# Altium integrated library vme6U_carrier_Cyc_V_SoC.IntLib: 56 symbols
Pins are listed as number, name and electrical type; pins without a type are passive.

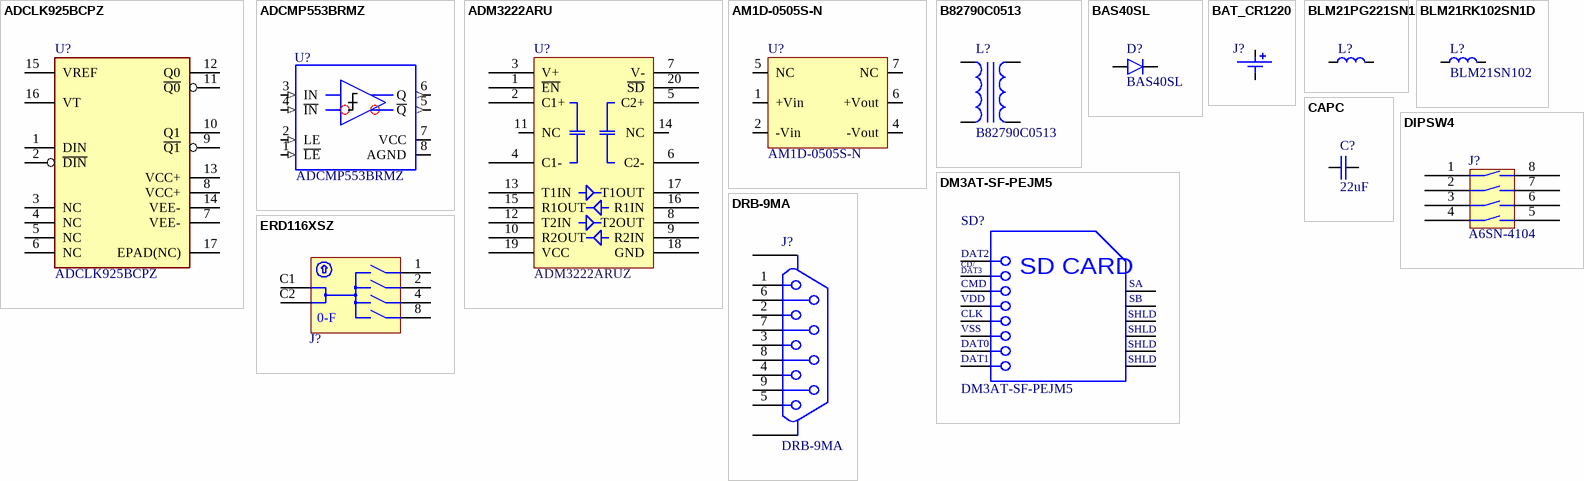
[diagram p0: symbols ADCLK925BCPZ to ERD116XSZ]

## ADCLK925BCPZ
designator U?
IC CLK FANOUT BUFFER 1:2 16LFCSP; Manufacturer: Silicon Labs; Number Of Inputs: 2; Standoff Height: 0mm; Number Of Outputs: 4; Pkg: LFCSP-16EP; Max Junction Temp: +125°C; Min Supply Voltage: 1.71V; Number Of Elements: 1; Nominal Supply Current: 65mA; Max Supply Voltage: 3.63V; Logic Function: Non-Inverting; Propagation Delay: 875ps; Maintainer: Evgeniy Kotov; SMD Solders: 17; THD Solders: 0; Manufacturer Part Number: ADCLK925BCPZ; Ambient Temperature Range High: +85°C; Device Class L2: Clock and Timing; Temperature: -40°C to +85°C; Automotive: No; Height: 0.9mm; ComponentLink2URL: https://www.silabs.com/documents/public/data-sheets/si5330x-datasheet.pdf; ComponentLink2Description: Datasheet; Temperature Range High: +85°C; Category: IC; Ambient Temperature Range Low: -40°C; Device Class L1: Integrated Circuits (ICs); Octopart: https://octopart.com/si53307-b-gm-silicon+labs-51374320; Mouser Description: Clock Buffer 1:2 Univ bufr/Lvl Trans 725MHz; Temperature Range Low: -40°C; Device Class L3: Clock Buffers; Ipc Land Pattern Name: QFN50P300X300X85-16; RoHS: TRUE; Digikey Description: IC CLK BUFFER 2:4 725MHZ 16QFN; Lead Free: Yes; PartField: ADCLK925BCPZ; Last Change Data: 09.03.2017; Value: ADCLK925BCPZ
footprint QFN50P300X300X100-17N-S150 (QFN, 0.50mm Pitch, Square; 4 pin X 4 pin, 3mm X 3mm X 1.00mm H Body (w/thermal tab 1.50 X 1.50mm), IPC Medium Density)
pins: 1 DIN, 2 ~{DIN}, 3 NC, 4 NC, 5 NC, 6 NC, 7 VEE- (power), 8 VCC+ (power), 9 ~{Q1}, 10 Q1, 11 ~{Q0}, 12 Q0, 13 VCC+, 14 VEE-, 15 VREF (power), 16 VT (power), 17 EPAD(NC) (power)

## ADCMP553BRMZ
designator U?
LVDS Comparator; Vendor: Analog Devices Inc; SolderOption: 0; Pkg: MSOP-8; SMD Solders: 8; Manufacturer_Part_Number: ADCMP553BRMZ; Value: ADCMP553BRMZ; PartField: ADCMP553BRMZ; THD Solders: 0
footprint SOP65P490X110-8N (SOP, 0.65mm pitch; 8 pin, 3.00mm W X 3.00mm L X 1.10mm H body, IPC Medium Density)
pins: 1 ~{LE} (in), 2 LE (in), 3 IN (in), 4 ~{IN} (in), 5 ~{Q} (out), 6 Q (out), 7 VCC (power), 8 AGND (power)

## ADM3222ARU
designator U?, comment ADM3222ARUZ
RS232; Pkg: TSSOP-20; SMD Solders: 20; THD Solders: 0; Vendor: Analog Devices; ComponentLink1URL: https://www.analog.com/media/en/technical-documentation/data-sheets/ADM3202_3222_1385.pdf; Last Change Date: 24.05.2019; PartField: ADM3222ARUZ; Value: ADM3222
footprint SOP65P640X110-20N (SOP, 20-Leads, Body 6.6x4.5mm (max), Pitch 0.65mm, IPC Medium Density)
pins: 1 ~{EN}, 2 C1+, 3 V+, 4 C1-, 5 C2+, 6 C2-, 7 V-, 8 T2OUT, 9 R2IN, 10 R2OUT, 11 NC, 12 T2IN, 13 T1IN, 14 NC, 15 R1OUT, 16 R1IN, 17 T1OUT, 18 GND, 19 VCC, 20 ~{SD}

## AM1D-0505S-N
designator U?
AM3G-0505DZ; Manufactuer: Aimtec; SolderOption: 0; Pkg: SIP-7pin; THD Solders: 7; HelpURL: http://www.aimtec.com/site/Aimtec/files/Datasheet/HighResolution/AM1D-NZ.pdf; Manufacturer: Aimtec; PartField: AM1D-0505S-N; Value: AM1D-0505S-N; Vendor: Aimtec; SMD Solders: 0
footprint SIP-7
pins: 1 +Vin, 2 -Vin, 4 -Vout, 5 NC, 6 +Vout, 7 NC

## B82790C0513
designator L?
Pkg: SMD 4 pin; SMD Solders: 4; THD Solders: 0; Vendor: Epcos; PartField: B82790C0513; Value: B82790C0513
footprint SMD_B82790 (Footprint not found)
pins: 1, 2, 3, 4

## BAS40SL
designator D?
Schottky Barrier Diode; Pkg: SOD-923F; Vendor: Vishay; Maintainer: Evgeniy Kotov; SMD Solders: 2; THD Solders: 0; Forward Current: 100mA; Reverse Voltage: 40V; Forward Voltage: 0.38V @ 1mA / 1V @ 40mA; Reverse Current: 15mA; PartField: BAS40SL; Release Date: 28.03.2017; Last Change Data: 28.03.2017; Temperature Range: -55°C to +150°C; Value: BAS40SL
footprint SOD_923
pins: 1 A, 2 C

## BAT_CR1220
designator J?, comment BC501SM  (value not drawn)
BATTERY HOLDER COIN 12.5MM SMD; SMD Solders: 2; THD Solders: 0; Maintainer: Evgeniy Kotov; Pkg: 12MM SMD; PartField: BC501SM; Last Change Data: 02.04.2017; Release Date: 02.04.2017; Value: BC501SM; ComponentLink1Description: Datasheet
footprint BAT_CR1220 (2 Contacts - Pitch 2.54mm - Single Row Straight Strip Male Header)
pins: 1 +, 2 -
1 alternate drawing of the same symbol

## BLM21PG221SN1
designator L?  (value not drawn)
Ferrite Beads, 0805, 220 Ohm, 2A; Pkg: 0805; Vendor: Murata; Maintainer: Evgeniy Kotov; SMD Solders: 2; THD Solders: 0; DC Current: 200mA; Tolerance: 25%; DC Resistance: 50mΩ; PartField: BLM21PG221SN1; Release Date: 30.03.2017; Last Change Data: 30.03.2017; Temperature Range: -55°C to +125°C; Value: BLM21PG221SN1
simulation model Inductor (Generic Inductor)
footprint INDC2012N (Chip Inductor, EIA 0805, Metric 2012, Body 2.0x1.2mm, IPC Medium Density)
pins: 1, 2

## BLM21RK102SN1D
designator L?  value BLM21SN102  (hidden comment: BLM21RK102SN1D)
Ferrite Beads, 0805, 1 kOhm; Pkg: 0805; Vendor: Murata; Maintainer: Evgeniy Kotov; SMD Solders: 2; THD Solders: 0; DC Current: 200mA; Tolerance: 25%; DC Resistance: 500mΩ; PartField: BLM21RK102SN1D; Release Date: 30.03.2017; Last Change Data: 30.03.2017; Temperature Range: -55°C to +125°C
simulation model Inductor (Generic Inductor)
footprint INDC2012N (Chip Inductor, EIA 0805, Metric 2012, Body 2.0x1.2mm, IPC Medium Density)
pins: 1, 2

## CAPC
designator C?, comment 22uF
Generic ceramic SMD capacitor; Pkg: 0805; Maintainer: Evgeniy Kotov; SMD Solders: 2; THD Solders: 0; PartField: 22uF; Last Change Data: 06.03.2017; Release Date: 06.03.2017; Value: 22uF
footprint CAPC1608N (Chip Capacitor, Body 1.6x0.8mm (0603), IPC Medium Density)
footprint CAPC2012N (Chip Capacitor, Body 2.0x1.25mm (0805), IPC Medium Density)
footprint CAPC3216N (Chip Capacitor, Body 3.2x1.6mm (1206), IPC Medium Density)
footprint CAPC3225N (Chip Capacitor, Body 3.2x2.5mm (1210), IPC Medium Density)
footprint CAPC5750N (Chip Capacitor, Body 5.7x5.0mm (2220), IPC Medium Density)
simulation model Capacitor (Generic Capacitor)
pins: 1, 2

## DIPSW4
designator J?, comment A6SN-4104
SMD DIP Switch, Omron A6H or A6SN series; SMD Solders: 8; THD Solders: 0; Pkg: SMD 8pin; Value: A6SN-4104; Manufacturer: Omron; PartField: A6SN-4104
footprint DIPSW4-A6SN8
pins: 1, 2, 3, 4, 5, 6, 7, 8

## DM3AT-SF-PEJM5
designator SD?
Micro SD Card Connector, 0.5 A, 125 V, -25 to 85 degC, 8-Pin SMD, RoHS, Tape and Reel; Manufacturer: Hirose Electric; Featured Product: DM3ATSeries; HTML Datasheet: DM3SeriesmicroSD.html; Other Names: HR1964DKR; Connector Type: ConnectorandEjector; Insertion, Removal Method: PushIn,PushOut; Card Type: SecureDigital-microSD™; Online Catalog: DM3Series; Number of Positions: 10(8+2); Product Training Modules: DM3SeriesmicroSDCardSockets; Pkg: SD card hlder; SMD Solders: 14; THD Solders: 0; Manufacturer URL: https://www.hirose.com; Contact Finish: Gold; Family: MemoryConnectors-PCCardSockets; Package Reference: DM3AT-8; Category: Connectors,Interconnects; Features: Switch; Mounting Type: SurfaceMount,RightAngle; Datasheet Version: Jun-10; Package Description: 8-Pin Surface Mount Device, Body 16.15 x 13.85 mm, Pitch 1.1 mm; Standard Package: 1; Contact Finish Thickness: -; Datasheet URL: https://ciiva.com/datasheet-click-46418261?src=ciiva&sig=4019062a; Mounting Feature: Normal,Standard-Top; Series: DM3; Packaging: Digi-Reel; Package URL: https://www.hirose.com/product/en/download_file/key_name/DM3/category/Catalog/doc_file_id/49662/?file_category_id=4&item_id=195&is_series=1; Ejector Side: -; Value: DM3AT-SF-PEJM5; Vendor: Hirose Electric; PartField: DM3AT-SF-PEJM5
footprint SD_HRS-DM3AT-8_V
pins: 1 DAT2, 2 CD/DAT3, 3 CMD, 4 VDD, 5 CLK, 6 VSS, 7 DAT0, 8 DAT1, 9 SA, 10 SB, 11 SHLD, 12 SHLD, 13 SHLD, 14 SHLD
text: CD/; DAT3; SD CARD

## DRB-9MA
designator J?
D-SUB; 9-pin, male, flange 7.2mm; SolderOption: 0; THD Solders: 11; PartField: DRB-9MA; Value: DRB-9MA; Pkg: DRB-9MA; SMD Solders: 0
footprint DRB-9MA
pins: 1, 2, 3, 4, 5, 6, 7, 8, 9, S1 SHLD, S2 SHLD

## ERD116XSZ
designator J?  (value not drawn)
Vendor: ECE; SolderOption: 0; Pkg: Rotary 6pin; THD Solders: 6; Value: ERD116XSZ; PartField: ERD116XSZ; SMD Solders: 0
footprint SW_ECE_ERD116XSZ (Body 7.4x7.4mm SMT Hexadecimal Rotary Switches)
pins: 1, 2, 4, 8, C1 C, C2 C
text: 0-F

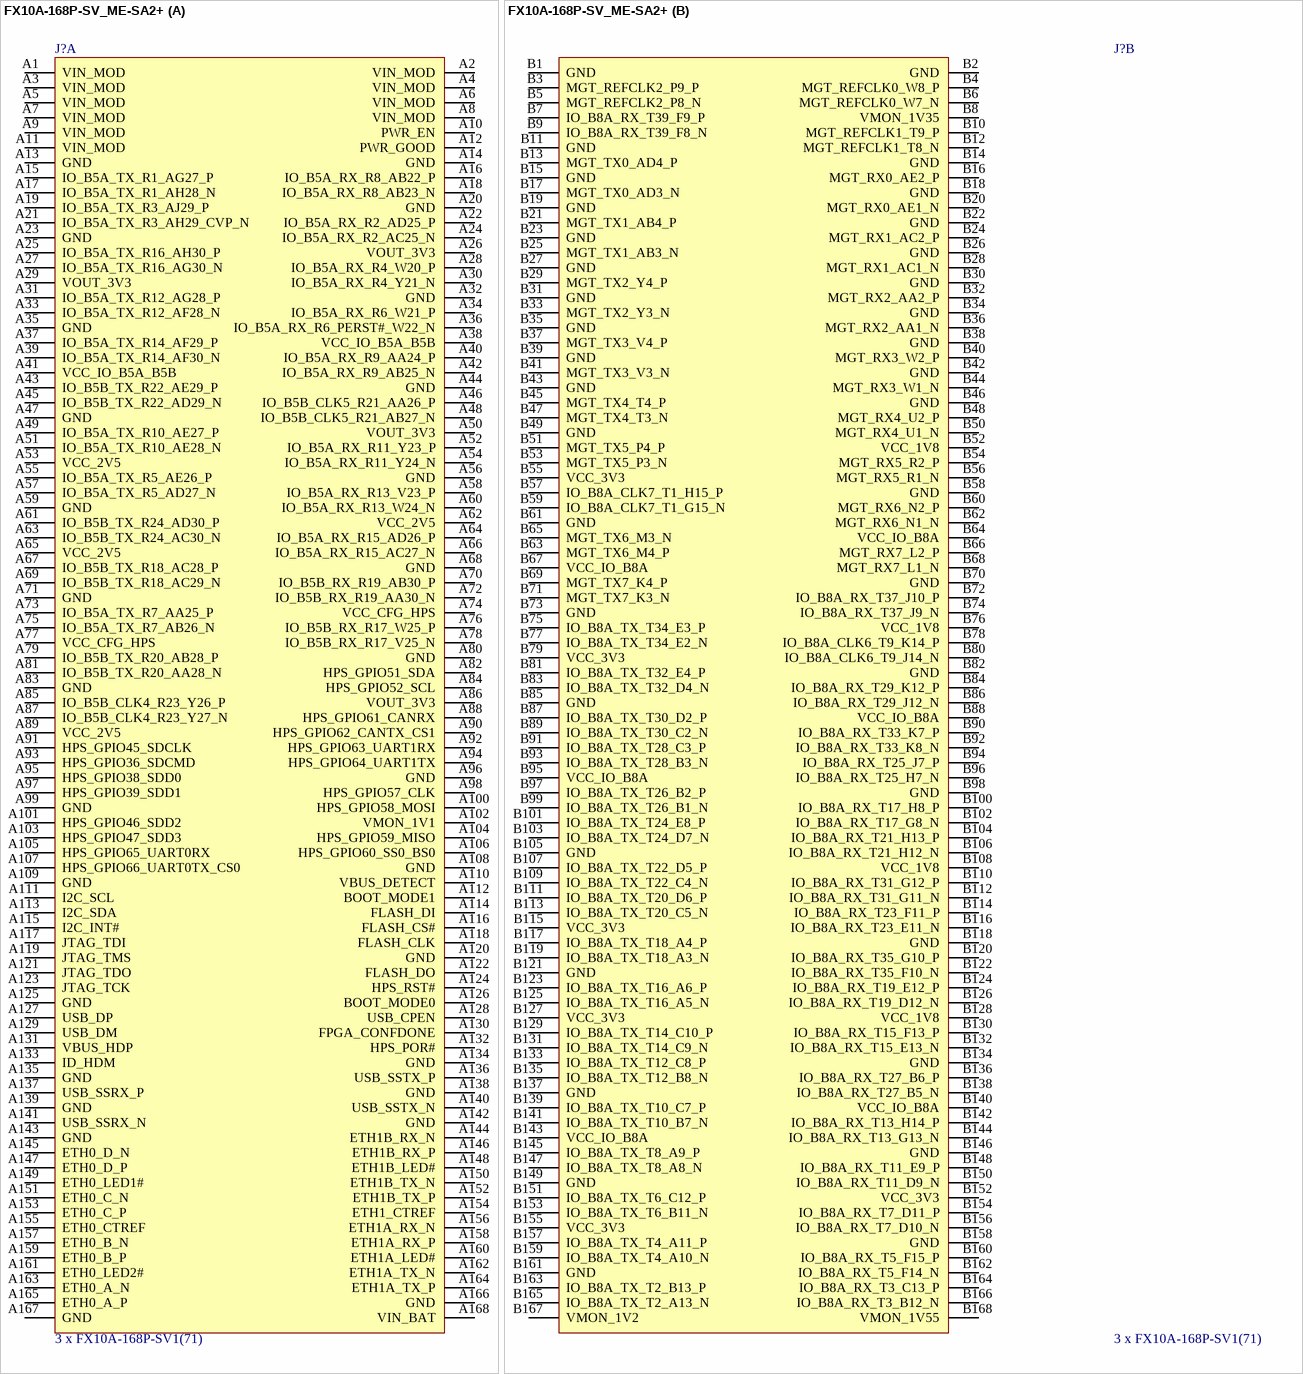
[diagram p1: symbol FX10A-168P-SV_ME-SA2+]

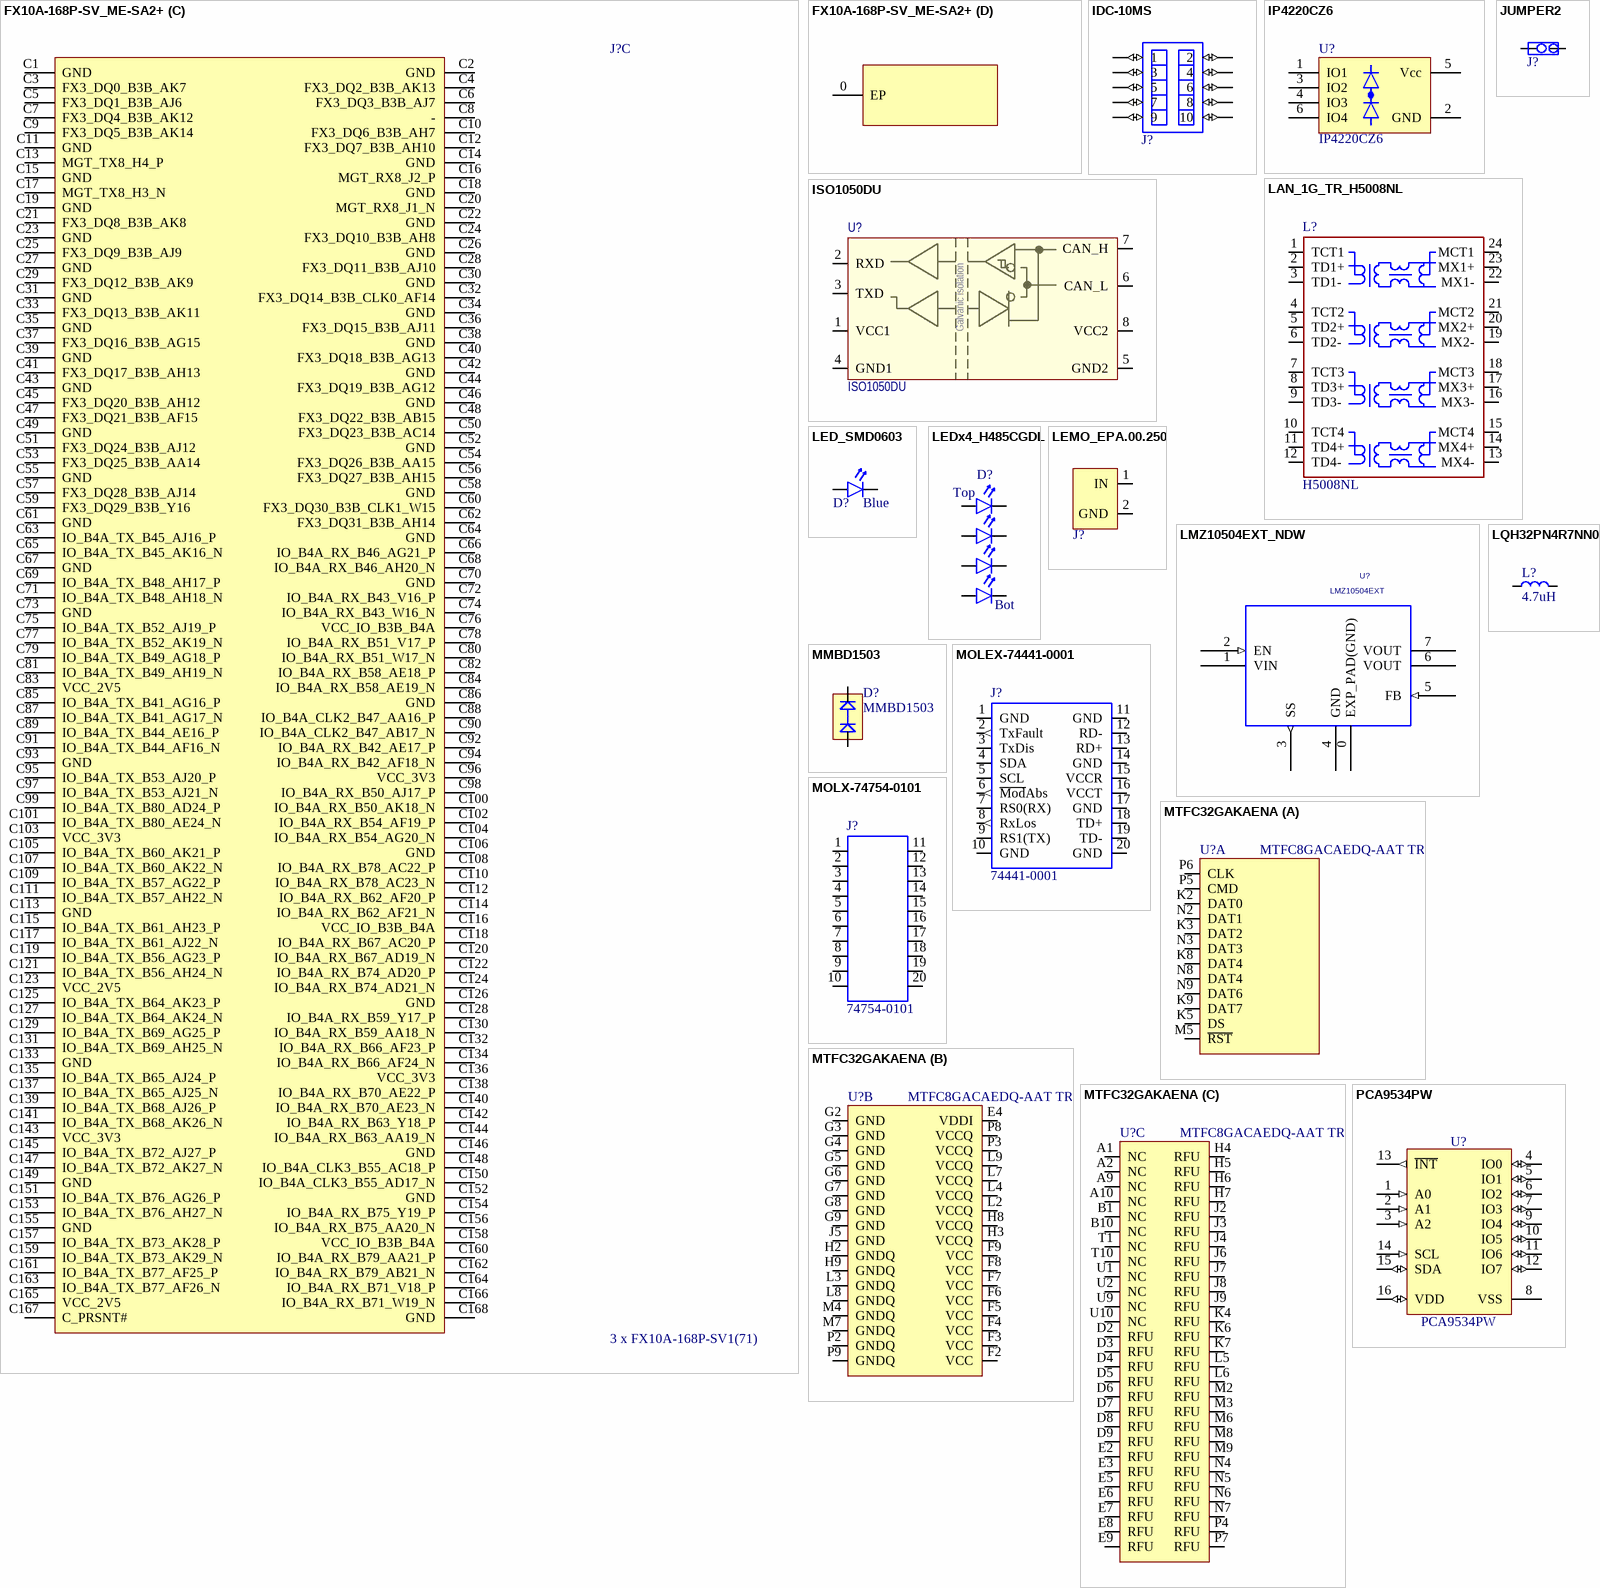
[diagram p2: symbols FX10A-168P-SV_ME-SA2+ to PCA9534PW]

## FX10A-168P-SV_ME-SA2+
designator J?, comment 3 x FX10A-168P-SV1(71)
Pin_Count: 168; SolderOption: 0; Pkg: SMD 170pin; SMD Solders: 170; HelpURL: https://www.hirose.com/product/document?clcode=CL0570-0044-8-71&productname=FX10A-168P-SV(71)&series=FX10&documenttype=Catalog&lang=ru&documentid=D31650_en; PartField: FX10A-168P-SV1(71); Value: 3 x FX10A-168P-SV1(71); THD Solders: 0
footprint Mercury_SA2p
part A pins: A1 VIN_MOD, A2 VIN_MOD, A3 VIN_MOD, A4 VIN_MOD, A5 VIN_MOD, A6 VIN_MOD, A7 VIN_MOD, A8 VIN_MOD, A9 VIN_MOD, A10 PWR_EN, A11 VIN_MOD, A12 PWR_GOOD, A13 GND, A14 GND, A15 IO_B5A_TX_R1_AG27_P, A16 IO_B5A_RX_R8_AB22_P, A17 IO_B5A_TX_R1_AH28_N, A18 IO_B5A_RX_R8_AB23_N, A19 IO_B5A_TX_R3_AJ29_P, A20 GND, A21 IO_B5A_TX_R3_AH29_CVP_N, A22 IO_B5A_RX_R2_AD25_P, A23 GND, A24 IO_B5A_RX_R2_AC25_N, A25 IO_B5A_TX_R16_AH30_P, A26 VOUT_3V3, A27 IO_B5A_TX_R16_AG30_N, A28 IO_B5A_RX_R4_W20_P, A29 VOUT_3V3, A30 IO_B5A_RX_R4_Y21_N, A31 IO_B5A_TX_R12_AG28_P, A32 GND, A33 IO_B5A_TX_R12_AF28_N, A34 IO_B5A_RX_R6_W21_P, A35 GND, A36 IO_B5A_RX_R6_PERST#_W22_N, A37 IO_B5A_TX_R14_AF29_P, A38 VCC_IO_B5A_B5B, A39 IO_B5A_TX_R14_AF30_N, A40 IO_B5A_RX_R9_AA24_P, A41 VCC_IO_B5A_B5B, A42 IO_B5A_RX_R9_AB25_N, A43 IO_B5B_TX_R22_AE29_P, A44 GND, A45 IO_B5B_TX_R22_AD29_N, A46 IO_B5B_CLK5_R21_AA26_P, A47 GND, A48 IO_B5B_CLK5_R21_AB27_N, A49 IO_B5A_TX_R10_AE27_P, A50 VOUT_3V3, A51 IO_B5A_TX_R10_AE28_N, A52 IO_B5A_RX_R11_Y23_P, A53 VCC_2V5, A54 IO_B5A_RX_R11_Y24_N, A55 IO_B5A_TX_R5_AE26_P, A56 GND, A57 IO_B5A_TX_R5_AD27_N, A58 IO_B5A_RX_R13_V23_P, A59 GND, A60 IO_B5A_RX_R13_W24_N, A61 IO_B5B_TX_R24_AD30_P, A62 VCC_2V5, A63 IO_B5B_TX_R24_AC30_N, A64 IO_B5A_RX_R15_AD26_P, A65 VCC_2V5, A66 IO_B5A_RX_R15_AC27_N, A67 IO_B5B_TX_R18_AC28_P, A68 GND, A69 IO_B5B_TX_R18_AC29_N, A70 IO_B5B_RX_R19_AB30_P, A71 GND, A72 IO_B5B_RX_R19_AA30_N, A73 IO_B5A_TX_R7_AA25_P, A74 VCC_CFG_HPS, A75 IO_B5A_TX_R7_AB26_N, A76 IO_B5B_RX_R17_W25_P, A77 VCC_CFG_HPS, A78 IO_B5B_RX_R17_V25_N, A79 IO_B5B_TX_R20_AB28_P, A80 GND, A81 IO_B5B_TX_R20_AA28_N, A82 HPS_GPIO51_SDA, A83 GND, A84 HPS_GPIO52_SCL, A85 IO_B5B_CLK4_R23_Y26_P, A86 VOUT_3V3, A87 IO_B5B_CLK4_R23_Y27_N, A88 HPS_GPIO61_CANRX, A89 VCC_2V5, A90 HPS_GPIO62_CANTX_CS1, A91 HPS_GPIO45_SDCLK, A92 HPS_GPIO63_UART1RX, A93 HPS_GPIO36_SDCMD, A94 HPS_GPIO64_UART1TX, A95 HPS_GPIO38_SDD0, A96 GND, A97 HPS_GPIO39_SDD1, A98 HPS_GPIO57_CLK, A99 GND, A100 HPS_GPIO58_MOSI, A101 HPS_GPIO46_SDD2, A102 VMON_1V1, A103 HPS_GPIO47_SDD3, A104 HPS_GPIO59_MISO, A105 HPS_GPIO65_UART0RX, A106 HPS_GPIO60_SS0_BS0, A107 HPS_GPIO66_UART0TX_CS0, A108 GND, A109 GND, A110 VBUS_DETECT, A111 I2C_SCL, A112 BOOT_MODE1, A113 I2C_SDA, A114 FLASH_DI, A115 I2C_INT#, A116 FLASH_CS#, A117 JTAG_TDI, A118 FLASH_CLK, A119 JTAG_TMS, A120 GND, A121 JTAG_TDO, A122 FLASH_DO, A123 JTAG_TCK, A124 HPS_RST#, A125 GND, A126 BOOT_MODE0, A127 USB_DP, A128 USB_CPEN, A129 USB_DM, A130 FPGA_CONFDONE, A131 VBUS_HDP, A132 HPS_POR#, A133 ID_HDM, A134 GND, A135 GND, A136 USB_SSTX_P, A137 USB_SSRX_P, A138 GND, A139 GND, A140 USB_SSTX_N, A141 USB_SSRX_N, A142 GND, A143 GND, A144 ETH1B_RX_N, A145 ETH0_D_N, A146 ETH1B_RX_P, A147 ETH0_D_P, A148 ETH1B_LED#, A149 ETH0_LED1#, A150 ETH1B_TX_N, A151 ETH0_C_N, A152 ETH1B_TX_P, A153 ETH0_C_P, A154 ETH1_CTREF, A155 ETH0_CTREF, A156 ETH1A_RX_N, A157 ETH0_B_N, A158 ETH1A_RX_P, A159 ETH0_B_P, A160 ETH1A_LED#, A161 ETH0_LED2#, A162 ETH1A_TX_N, A163 ETH0_A_N, A164 ETH1A_TX_P, A165 ETH0_A_P, A166 GND, A167 GND, A168 VIN_BAT
part B pins: B1 GND, B2 GND, B3 MGT_REFCLK2_P9_P, B4 MGT_REFCLK0_W8_P, B5 MGT_REFCLK2_P8_N, B6 MGT_REFCLK0_W7_N, B7 IO_B8A_RX_T39_F9_P, B8 VMON_1V35, B9 IO_B8A_RX_T39_F8_N, B10 MGT_REFCLK1_T9_P, B11 GND, B12 MGT_REFCLK1_T8_N, B13 MGT_TX0_AD4_P, B14 GND, B15 GND, B16 MGT_RX0_AE2_P, B17 MGT_TX0_AD3_N, B18 GND, B19 GND, B20 MGT_RX0_AE1_N, B21 MGT_TX1_AB4_P, B22 GND, B23 GND, B24 MGT_RX1_AC2_P, B25 MGT_TX1_AB3_N, B26 GND, B27 GND, B28 MGT_RX1_AC1_N, B29 MGT_TX2_Y4_P, B30 GND, B31 GND, B32 MGT_RX2_AA2_P, B33 MGT_TX2_Y3_N, B34 GND, B35 GND, B36 MGT_RX2_AA1_N, B37 MGT_TX3_V4_P, B38 GND, B39 GND, B40 MGT_RX3_W2_P, B41 MGT_TX3_V3_N, B42 GND, B43 GND, B44 MGT_RX3_W1_N, B45 MGT_TX4_T4_P, B46 GND, B47 MGT_TX4_T3_N, B48 MGT_RX4_U2_P, B49 GND, B50 MGT_RX4_U1_N, B51 MGT_TX5_P4_P, B52 VCC_1V8, B53 MGT_TX5_P3_N, B54 MGT_RX5_R2_P, B55 VCC_3V3, B56 MGT_RX5_R1_N, B57 IO_B8A_CLK7_T1_H15_P, B58 GND, B59 IO_B8A_CLK7_T1_G15_N, B60 MGT_RX6_N2_P, B61 GND, B62 MGT_RX6_N1_N, B63 MGT_TX6_M4_P, B64 VCC_IO_B8A, B65 MGT_TX6_M3_N, B66 MGT_RX7_L2_P, B67 VCC_IO_B8A, B68 MGT_RX7_L1_N, B69 MGT_TX7_K4_P, B70 GND, B71 MGT_TX7_K3_N, B72 IO_B8A_RX_T37_J10_P, B73 GND, B74 IO_B8A_RX_T37_J9_N, B75 IO_B8A_TX_T34_E3_P, B76 VCC_1V8, B77 IO_B8A_TX_T34_E2_N, B78 IO_B8A_CLK6_T9_K14_P, B79 VCC_3V3, B80 IO_B8A_CLK6_T9_J14_N, B81 IO_B8A_TX_T32_E4_P, B82 GND, B83 IO_B8A_TX_T32_D4_N, B84 IO_B8A_RX_T29_K12_P, B85 GND, B86 IO_B8A_RX_T29_J12_N, B87 IO_B8A_TX_T30_D2_P, B88 VCC_IO_B8A, B89 IO_B8A_TX_T30_C2_N, B90 IO_B8A_RX_T33_K7_P, B91 IO_B8A_TX_T28_C3_P, B92 IO_B8A_RX_T33_K8_N, B93 IO_B8A_TX_T28_B3_N, B94 IO_B8A_RX_T25_J7_P, B95 VCC_IO_B8A, B96 IO_B8A_RX_T25_H7_N, B97 IO_B8A_TX_T26_B2_P, B98 GND, B99 IO_B8A_TX_T26_B1_N, B100 IO_B8A_RX_T17_H8_P, B101 IO_B8A_TX_T24_E8_P, B102 IO_B8A_RX_T17_G8_N, B103 IO_B8A_TX_T24_D7_N, B104 IO_B8A_RX_T21_H13_P, B105 GND, B106 IO_B8A_RX_T21_H12_N, B107 IO_B8A_TX_T22_D5_P, B108 VCC_1V8, B109 IO_B8A_TX_T22_C4_N, B110 IO_B8A_RX_T31_G12_P, B111 IO_B8A_TX_T20_D6_P, B112 IO_B8A_RX_T31_G11_N, B113 IO_B8A_TX_T20_C5_N, B114 IO_B8A_RX_T23_F11_P, B115 VCC_3V3, B116 IO_B8A_RX_T23_E11_N, B117 IO_B8A_TX_T18_A4_P, B118 GND, B119 IO_B8A_TX_T18_A3_N, B120 IO_B8A_RX_T35_G10_P, B121 GND, B122 IO_B8A_RX_T35_F10_N, B123 IO_B8A_TX_T16_A6_P, B124 IO_B8A_RX_T19_E12_P, B125 IO_B8A_TX_T16_A5_N, B126 IO_B8A_RX_T19_D12_N, B127 VCC_3V3, B128 VCC_1V8, B129 IO_B8A_TX_T14_C10_P, B130 IO_B8A_RX_T15_F13_P, B131 IO_B8A_TX_T14_C9_N, B132 IO_B8A_RX_T15_E13_N, B133 IO_B8A_TX_T12_C8_P, B134 GND, B135 IO_B8A_TX_T12_B8_N, B136 IO_B8A_RX_T27_B6_P, B137 GND, B138 IO_B8A_RX_T27_B5_N, B139 IO_B8A_TX_T10_C7_P, B140 VCC_IO_B8A, B141 IO_B8A_TX_T10_B7_N, B142 IO_B8A_RX_T13_H14_P, B143 VCC_IO_B8A, B144 IO_B8A_RX_T13_G13_N, B145 IO_B8A_TX_T8_A9_P, B146 GND, B147 IO_B8A_TX_T8_A8_N, B148 IO_B8A_RX_T11_E9_P, B149 GND, B150 IO_B8A_RX_T11_D9_N, B151 IO_B8A_TX_T6_C12_P, B152 VCC_3V3, B153 IO_B8A_TX_T6_B11_N, B154 IO_B8A_RX_T7_D11_P, B155 VCC_3V3, B156 IO_B8A_RX_T7_D10_N, B157 IO_B8A_TX_T4_A11_P, B158 GND, B159 IO_B8A_TX_T4_A10_N, B160 IO_B8A_RX_T5_F15_P, B161 GND, B162 IO_B8A_RX_T5_F14_N, B163 IO_B8A_TX_T2_B13_P, B164 IO_B8A_RX_T3_C13_P, B165 IO_B8A_TX_T2_A13_N, B166 IO_B8A_RX_T3_B12_N, B167 VMON_1V2, B168 VMON_1V55
part C pins: C1 GND, C2 GND, C3 FX3_DQ0_B3B_AK7, C4 FX3_DQ2_B3B_AK13, C5 FX3_DQ1_B3B_AJ6, C6 FX3_DQ3_B3B_AJ7, C7 FX3_DQ4_B3B_AK12, C8 -, C9 FX3_DQ5_B3B_AK14, C10 FX3_DQ6_B3B_AH7, C11 GND, C12 FX3_DQ7_B3B_AH10, C13 MGT_TX8_H4_P, C14 GND, C15 GND, C16 MGT_RX8_J2_P, C17 MGT_TX8_H3_N, C18 GND, C19 GND, C20 MGT_RX8_J1_N, C21 FX3_DQ8_B3B_AK8, C22 GND, C23 GND, C24 FX3_DQ10_B3B_AH8, C25 FX3_DQ9_B3B_AJ9, C26 GND, C27 GND, C28 FX3_DQ11_B3B_AJ10, C29 FX3_DQ12_B3B_AK9, C30 GND, C31 GND, C32 FX3_DQ14_B3B_CLK0_AF14, C33 FX3_DQ13_B3B_AK11, C34 GND, C35 GND, C36 FX3_DQ15_B3B_AJ11, C37 FX3_DQ16_B3B_AG15, C38 GND, C39 GND, C40 FX3_DQ18_B3B_AG13, C41 FX3_DQ17_B3B_AH13, C42 GND, C43 GND, C44 FX3_DQ19_B3B_AG12, C45 FX3_DQ20_B3B_AH12, C46 GND, C47 FX3_DQ21_B3B_AF15, C48 FX3_DQ22_B3B_AB15, C49 GND, C50 FX3_DQ23_B3B_AC14, C51 FX3_DQ24_B3B_AJ12, C52 GND, C53 FX3_DQ25_B3B_AA14, C54 FX3_DQ26_B3B_AA15, C55 GND, C56 FX3_DQ27_B3B_AH15, C57 FX3_DQ28_B3B_AJ14, C58 GND, C59 FX3_DQ29_B3B_Y16, C60 FX3_DQ30_B3B_CLK1_W15, C61 GND, C62 FX3_DQ31_B3B_AH14, C63 IO_B4A_TX_B45_AJ16_P, C64 GND, C65 IO_B4A_TX_B45_AK16_N, C66 IO_B4A_RX_B46_AG21_P, C67 GND, C68 IO_B4A_RX_B46_AH20_N, C69 IO_B4A_TX_B48_AH17_P, C70 GND, C71 IO_B4A_TX_B48_AH18_N, C72 IO_B4A_RX_B43_V16_P, C73 GND, C74 IO_B4A_RX_B43_W16_N, C75 IO_B4A_TX_B52_AJ19_P, C76 VCC_IO_B3B_B4A, C77 IO_B4A_TX_B52_AK19_N, C78 IO_B4A_RX_B51_V17_P, C79 IO_B4A_TX_B49_AG18_P, C80 IO_B4A_RX_B51_W17_N, C81 IO_B4A_TX_B49_AH19_N, C82 IO_B4A_RX_B58_AE18_P, C83 VCC_2V5, C84 IO_B4A_RX_B58_AE19_N, C85 IO_B4A_TX_B41_AG16_P, C86 GND, C87 IO_B4A_TX_B41_AG17_N, C88 IO_B4A_CLK2_B47_AA16_P, C89 IO_B4A_TX_B44_AE16_P, C90 IO_B4A_CLK2_B47_AB17_N, C91 IO_B4A_TX_B44_AF16_N, C92 IO_B4A_RX_B42_AE17_P, C93 GND, C94 IO_B4A_RX_B42_AF18_N, C95 IO_B4A_TX_B53_AJ20_P, C96 VCC_3V3, C97 IO_B4A_TX_B53_AJ21_N, C98 IO_B4A_RX_B50_AJ17_P, C99 IO_B4A_TX_B80_AD24_P, C100 IO_B4A_RX_B50_AK18_N, C101 IO_B4A_TX_B80_AE24_N, C102 IO_B4A_RX_B54_AF19_P, C103 VCC_3V3, C104 IO_B4A_RX_B54_AG20_N, C105 IO_B4A_TX_B60_AK21_P, C106 GND, C107 IO_B4A_TX_B60_AK22_N, C108 IO_B4A_RX_B78_AC22_P, C109 IO_B4A_TX_B57_AG22_P, C110 IO_B4A_RX_B78_AC23_N, C111 IO_B4A_TX_B57_AH22_N, C112 IO_B4A_RX_B62_AF20_P, C113 GND, C114 IO_B4A_RX_B62_AF21_N, C115 IO_B4A_TX_B61_AH23_P, C116 VCC_IO_B3B_B4A, C117 IO_B4A_TX_B61_AJ22_N, C118 IO_B4A_RX_B67_AC20_P, C119 IO_B4A_TX_B56_AG23_P, C120 IO_B4A_RX_B67_AD19_N, C121 IO_B4A_TX_B56_AH24_N, C122 IO_B4A_RX_B74_AD20_P, C123 VCC_2V5, C124 IO_B4A_RX_B74_AD21_N, C125 IO_B4A_TX_B64_AK23_P, C126 GND, C127 IO_B4A_TX_B64_AK24_N, C128 IO_B4A_RX_B59_Y17_P, C129 IO_B4A_TX_B69_AG25_P, C130 IO_B4A_RX_B59_AA18_N, C131 IO_B4A_TX_B69_AH25_N, C132 IO_B4A_RX_B66_AF23_P, C133 GND, C134 IO_B4A_RX_B66_AF24_N, C135 IO_B4A_TX_B65_AJ24_P, C136 VCC_3V3, C137 IO_B4A_TX_B65_AJ25_N, C138 IO_B4A_RX_B70_AE22_P, C139 IO_B4A_TX_B68_AJ26_P, C140 IO_B4A_RX_B70_AE23_N, C141 IO_B4A_TX_B68_AK26_N, C142 IO_B4A_RX_B63_Y18_P, C143 VCC_3V3, C144 IO_B4A_RX_B63_AA19_N, C145 IO_B4A_TX_B72_AJ27_P, C146 GND, C147 IO_B4A_TX_B72_AK27_N, C148 IO_B4A_CLK3_B55_AC18_P, C149 GND, C150 IO_B4A_CLK3_B55_AD17_N, C151 IO_B4A_TX_B76_AG26_P, C152 GND, C153 IO_B4A_TX_B76_AH27_N, C154 IO_B4A_RX_B75_Y19_P, C155 GND, C156 IO_B4A_RX_B75_AA20_N, C157 IO_B4A_TX_B73_AK28_P, C158 VCC_IO_B3B_B4A, C159 IO_B4A_TX_B73_AK29_N, C160 IO_B4A_RX_B79_AA21_P, C161 IO_B4A_TX_B77_AF25_P, C162 IO_B4A_RX_B79_AB21_N, C163 IO_B4A_TX_B77_AF26_N, C164 IO_B4A_RX_B71_V18_P, C165 VCC_2V5, C166 IO_B4A_RX_B71_W19_N, C167 C_PRSNT#, C168 GND
part D pins: 0 EP

## IDC-10MS
designator J?, comment IDC-10MC  (value not drawn)
Connector, 5x2, Male, 2.54mm Pitch, Strait contacts, with Body; SMD Solders: 0; THD Solders: 10; Maintainer: Evgeniy Kotov; Pkg: IDC-10; PartField: IDC-10MC; Last Change Data: 28.03.2017; Release Date: 28.03.2017; Value: IDC-10MC; ComponentLink1Description: Datasheet
footprint PLD-10 (10 Contacts - Pitch 2.54mm - Dual Row Straight Strip Header)
pins: 1 (io), 2 (io), 3 (io), 4 (io), 5 (io), 6 (io), 7 (io), 8 (io), 9 (io), 10 (io)

## IP4220CZ6
designator U?
Transimpedance Amplifier; Selectable-Feedback Resistance; Pkg: SOT457; SMD Solders: 6; THD Solders: 0; Maintainer: Evgeniy Kotov; Vendor: NXP; PartField: IP4220CZ6; ComponentLink1URL: http://assets.nexperia.com/documents/data-sheet/IP4220CZ6.pdf; ComponentLink1Description: Datasheet; Last Change Date: 28.03.2017; Release Date: 28.03.2017; Value: IP4220CZ6
footprint SOT95P285X110-6N (SOT, 0.95mm, pitch; 6 pin,1.625mm W X 3.025mm L X 1.10mm H body, IPC Medium Density)
pins: 1 IO1, 2 GND, 3 IO2, 4 IO3, 5 Vcc, 6 IO4

## ISO1050DU
designator U?
Order: main; Pkg: SOP-8; SMD Solders: 8; THD Solders: 0; PartField: ISO1050DU; Value: ISO1050DU
footprint SOP8 (ti)
pins: 1 VCC1, 2 RXD, 3 TXD, 4 GND1, 5 GND2, 6 CAN_L, 7 CAN_H, 8 VCC2
text: Galvanic isolation

## JUMPER2
designator J?, comment PLS-2  (value not drawn)
SolderOption: 0; THD Solders: 2; Value: PLS-2; PartField: PLS-2; Pkg: PLS-2; SMD Solders: 0
footprint PLS-2
footprint PLS-2R
footprint PLS2-2R
pins: 1, 2

## LAN_1G_TR_H5008NL
designator L?, comment H5008NL
LAN Transformer fog 1GbE, 12 coils, 4 pairs.; Vendor: Pulse Electronics; Maintainer: Evgeniy Kotov; SMD Solders: 2; THD Solders: 0; Tolerance: 2%; PartField: H5008NL; Pkg: H5008NL; Release Date: 31.03.2017; Last Change Data: 31.03.2017; Temperature Range: -25°C to +85°C; Value: H5008NL
footprint SMD_HX508
pins: 1 TCT1, 2 TD1+, 3 TD1-, 4 TCT2, 5 TD2+, 6 TD2-, 7 TCT3, 8 TD3+, 9 TD3-, 10 TCT4, 11 TD4+, 12 TD4-, 13 MX4-, 14 MX4+, 15 MCT4, 16 MX3-, 17 MX3+, 18 MCT3, 19 MX2-, 20 MX2+, 21 MCT2, 22 MX1-, 23 MX1+, 24 MCT1

## LED_SMD0603
designator D?, comment Color: Blue  (hidden comment: LB Q39E-N1OO-35-1)
SMD Led, 0603; Pkg: 0603; Vendor: Vishay; Maintainer: Evgeniy Kotov; SMD Solders: 2; THD Solders: 0; Forward Current: 5mA; PartField: LB Q39E-N1OO-35-1; Release Date: 28.03.2017; Last Change Data: 28.03.2017; Temperature Range: -55°C to +150°C; Value: LB Q39E-N1OO-35-1
footprint LEDC1608N (Chip Capacitor, Body 1.6x0.8mm (0603), IPC Medium Density)
pins: 1 C, 2 A

## LEDx4_H485CGDL
designator D?, comment H485CGDL  (value not drawn)
LED Circuit Board Indicator 4 High Green (x 4) Diffused 2.1V Round with Domed Top, 1.80mm Through Hole; Pkg: 8 pin THD Led; Vendor: Bivar Inc.; Maintainer: Evgeniy Kotov; SMD Solders: 0; THD Solders: 8; Forward Current: 5mA; PartField: H485CGDL; Release Date: 28.03.2017; Last Change Data: 28.03.2017; Temperature Range: -55°C to +150°C; Value: H485CGDL; Color: Green
footprint LED_H485C (Quad Led Holder, Led 1.8mm dia)
pins: 1 A, 2 C, 3 A, 4 C, 5 A, 6 C, 7 A, 8 C
text: Top; Bot

## LEMO_EPA.00.250
designator J?, comment DNP  (value not drawn)
PartField: EPA.00.250.NTN; SolderOption: 0; Pkg: LEMO 5pin; THD Solders: 5; Value: DNP; SMD Solders: 0
footprint LEMO_EPA.00.250.NTN (50 Ohm size 00 Coaxial Straight socket)
pins: 1 IN, 2 GND

## LMZ10504EXT_NDW
designator U?, comment LMZ10504EXT
4A, SIMPLE SWITCHER® Power Module with 5.5V Maximum Input Voltage for Military and Rugged Applications; Manufacturer: Texas Instruments; Manufacturer_Part_Number: lmz10504ext_ndw_7; NSC_PackageReference: TZA07A; Pkg: PMOD-7EP; SMD Solders: 8; THD Solders: 0; Value: LMZ10504EXT; HelpURL: http://www.ti.com/lit/ds/symlink/lmz10504ext.pdf; basePN: LMZ10504EXT; Vendor: Texas Instruments; PartField: LMZ10504EXT
footprint TO-PMOD7 (TO-263, TO,1.27mm pitch;7 pin,14.10mm L X 8.64mm W X 4.64mm H body, IPC Medium Density)
pins: 0 EXP_PAD(GND), 1 VIN (power), 2 EN (in), 3 SS (out), 4 GND (power), 5 FB (in), 6 VOUT (power), 7 VOUT (power)
1 alternate drawing of the same symbol
